# Altium footprint library Cty1.PcbLib: 1378 footprints (part 86 of 87)
Each footprint in its own frame and in the unit in brackets; x right, y up, seen from the top. Pads: shape width x height; smd on the part's side, far side on the other; paste and mask are expansions set on the pad; w line width, h text height; cw(c..) or ccw(c..) is an arc to the next point about the centre after c.
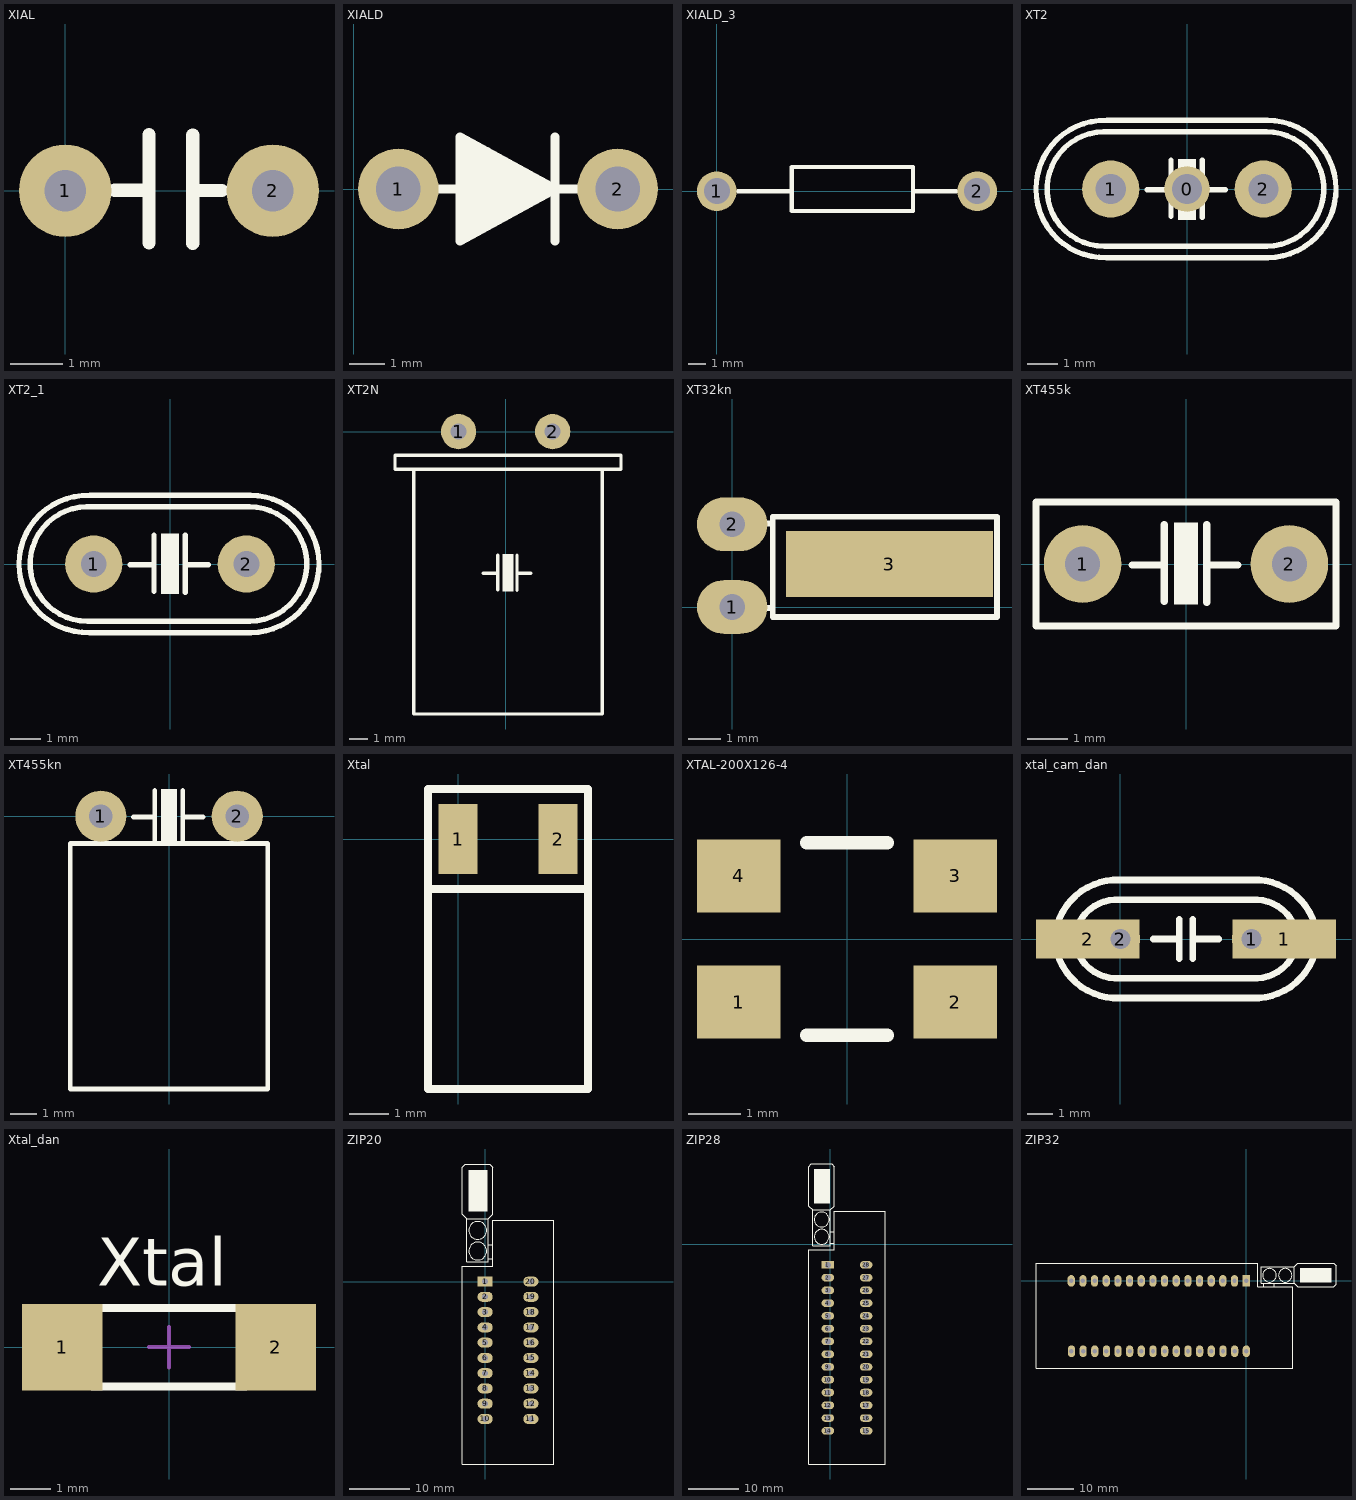
[diagram p85: the footprints below, top view; thin cyan lines are the x and y axes]

## XIAL [mil]
pads (2):
  round 70 hole 31.5 unplated: 1(0,0) 2(157.48,0)
Top Overlay:
  lines w10: 37.4,0.4 53.6,0.4 63.6,0.4 ; 63.6,-39.6 63.6,0.4 ; 63.6,42.4 63.6,0.4 ; 96.8,-39.8 96.8,42.2 ; 96.8,0.2 104.8,0.2 119,0.2

## XIALD [mil]
pads (2):
  round 90 hole 50 unplated: 1(50,0) 2(295,0)
Top Overlay:
  lines w10: 65,0 119,0 ; 127,-48 127,50 ; 127,46 135,46 135,-42 143,-42 143,42 149,42 149,-32 157,-32 157,34 163,34 163,-28 171,-28 171,24 179,24 179,-20 185,-20 185,18 191,18 191,-14 197,-14 197,12 201,12 201,-8 207,-8 ; 220,0 265,0 ; 225,-58 225,0 ; 225,58 225,0 ; 119,0 119,58 225,0 ; 119,0 119,-58 225,0 ; 207,-8 207,8 211,8 211,-8 207,-8

## XIALD_3 [mil]
pads (2):
  round 90 hole 59.05 unplated: 1(0,0) 2(590.55,0)
Top Overlay:
  lines w10: 47.95,0 166.06,0 ; 447.59,0 542.76,0 ; 170,-45 170,55 445,55 445,-45 170,-45

## XT2 [mm] "Footpin for Crystal 2 pin"
pads (3):
  round 1.524 hole 1: 0(0,0)
  round 1.905 hole 1: 1(-2.54,0) 2(2.54,0)
Top Overlay:
  region: 0.292,0.991 0.292,-1.016 -0.292,-1.016 -0.292,0.991
  lines w0.178: -2.769,1.905 ccw(c-2.756,0) -2.75,-1.905 ; -2.717,-1.905 2.617,-1.905 ; -2.692,1.905 2.642,1.905 ; -2.668,-2.286 2.69,-2.286 ccw(c2.675,0) 2.668,2.286 -2.666,2.286 ccw(c-2.743,0.001) -2.668,-2.283 ; -1.321,-0.025 -0.533,-0.025 ; -0.533,-0.914 -0.533,0.965 ; 0.508,-0.94 0.508,0.965 ; 0.508,-0.025 1.27,-0.025 ; 2.642,1.905 cw(c2.647,0) 2.66,-1.905
3D body "SW3dPS-HP49US.STEP": height 3.5, standoff -4, extent -5.929,-2.364 5.421,2.286

## XT2_1 [mil] "Footpin for Crystal 2 pin"
pads (2):
  round 75 hole 34: 1(-100,0) 2(100,0)
Top Overlay:
  region: 11.5,40 11.5,-39 -11.5,-39 -11.5,40
  lines w7: -109,75 ccw(c-108.5,0) -108.27,-75 ; -106.97,-75 103.03,-75 ; -105.97,75 104.03,75 ; -105.02,-90 105.91,-90 ccw(c105.31,0) 105.03,90 -104.97,90.01 ccw(c-108,0.06) -105.02,-89.89 ; -52,-1 -21,-1 ; -21,-36 -21,38 ; 20,-37 20,38 ; 20,-1 50,-1 ; 104,75 cw(c104.23,0) 104.73,-75
3D body "SW3dPS-HP49US.STEP": height 137.8, standoff -157.48, extent -233.43,-93.07 213.43,90

## XT2N [mil] "Crystal 2pin, high 200 mil"
height 200
pads (2):
  round 75 hole 34: 1(-100,0) 2(100,0)
Top Overlay:
  region: 16.5,-260 16.5,-339 -6.5,-339 -6.5,-260
  lines w7: -48,-301 -17,-301 ; -17,-336 -17,-262 ; 24,-337 24,-262 ; 24,-301 54,-301 ; -235,-80 -195,-80 ; -235,-80 -235,-50 ; -235,-80 -195,-80 ; -235,-80 -235,-50 ; -235,-50 245,-50 ; -235,-50 245,-50 ; -195,-600 -195,-80 ; -195,-600 205,-600 ; -195,-600 -195,-80 ; -195,-600 205,-600 ; -195,-80 205,-80 ; -195,-80 205,-80 ; 205,-600 205,-80 ; 205,-600 205,-80 ; 205,-80 245,-80 ; 205,-80 245,-80 ; 245,-80 245,-50 ; 245,-80 245,-50
3D body "SW3dPS-HC49U.STEP": height 91.44, standoff -92.52, extent -209.86,-594.33 230,14.33

## XT32kn [mil] "Crystal for 32,768kHz, 2pin"
height 150
pads (3):
  oval 85x65 hole 31: 1(0,0) 2(0,100)
  rect 250x80 smd: 3(190,52)
Top Overlay:
  lines w7: 34,-1 49,-1 ; 35,101 49,101 ; 49,101 49,-12 320,-12 320,109 49,109 49,101

## XT455k [mil] "Thach anh 455khz (Infrared)"
pads (2):
  round 75 hole 34: 1(-100,0) 2(100,0)
Top Overlay:
  region: 11.5,40 11.5,-39 -11.5,-39 -11.5,40
  lines w7: -52,-1 -21,-1 ; -21,-36 -21,38 ; 20,-37 20,38 ; 20,-1 50,-1 ; -145,-60 -145,60 145,60 145,-60 -145,-60

## XT455kn [mil] "Thach anh 455khz (Infrared)"
pads (2):
  round 75 hole 34: 1(-100,0) 2(100,0)
Top Overlay:
  region: 11.5,40 11.5,-39 -11.5,-39 -11.5,40
  lines w7: -52,-1 -21,-1 ; -21,-36 -21,38 ; 20,-37 20,38 ; 20,-1 50,-1 ; -145,-400 -145,-40 145,-40 145,-400 -145,-400

## Xtal [mm] "thach anh dan loai nho"
height 0.6
pads (2):
  rect 1x1.778 smd: 1(0,0) 2(2.54,0)
Top Overlay:
  lines w0.2: -0.762,-1.27 3.302,-1.27 ; -0.762,-6.35 3.302,-6.35 3.302,1.27 -0.762,1.27 -0.762,-5.588 -0.762,-6.35

## XTAL-200X126-4 [mil]
pads (4):
  rect 63x55 smd: 1(-81.5,-47.5) 2(81.5,-47.5) 3(81.5,47.5) 4(-81.5,47.5)
Top Overlay:
  lines w10: -30.5,-72.5 30.5,-72.5 ; -30.5,72.5 30.5,72.5
3D body: height 39.37, standoff 0, extent -114.46,-46.87 113.11,46.73
3D body: height 19.68, standoff 0, extent -97.83,24.91 -62.28,51.12
3D body: height 19.68, standoff 0, extent 67.17,24.91 102.72,51.12
3D body: height 19.68, standoff 0, extent -103.01,-51.67 -67.46,-25.46
3D body: height 19.68, standoff 0, extent 62.19,-52.22 97.74,-26.01

## xtal_cam_dan [mil]
pads (4):
  round 60 hole 30: 1(200,0) 2(0,0)
  rect 157.48x60 smd: 1(250,0) 2(-50,0)
Top Overlay:
  lines w10: 50,0 60,0 90,0 ; 90,-30 90,30 ; 110,-30 110,30 ; 110,0 150,0 120,0 ; -100,0 cw(c-5,-5) 0,90 200,90 cw(c205,-5) 300,0 cw(c205,5) 200,-90 0,-90 cw(c-5,5) -100,0 ; -70,0 cw(c-5,-5) 0,60 200,60 cw(c205,-5) 270,0 cw(c205,5) 200,-60 0,-60 cw(c-5,5) -70,0

## Xtal_dan [mm] "Thach Anh Dan 5.08mm"
height 3
pads (2):
  rect 2x2.15 smd: 1(-2.65,0) 2(2.65,0)
Top Overlay:
  lines w0.2: -1.9,-0.975 1.9,-0.975 ; -1.9,0.975 1.9,0.975
  text "Xtal" at -1.778,1.524 h1.2
Mechanical 13:
  lines w0.1: -2.54,-1 -2.54,1 2.54,1 2.54,-1 -2.54,-1
Mechanical 15:
  lines w0.1: -0.5,0 0.5,0 ; 0,-0.5 0,0.5
3D body: height 3, standoff 0, extent -2.54,-1 2.54,1

## ZIP20 [mil] "DIP 20, W 600mil/ L 1600mil"
height 300
pads (20):
  rect 100x65 hole 38: 1(0,0)
  oval 100x65 hole 38: 2(0,-100) 3(0,-200) 4(0,-300) 5(0,-400) 6(0,-500) 7(0,-600) 8(0,-700) 9(0,-800) 10(0,-900) 11(300,-900) 12(300,-800) 13(300,-700) 14(300,-600) 15(300,-500) 16(300,-400) 17(300,-300) 18(300,-200) 19(300,-100) 20(300,0)
Top Overlay:
  circle w7: c-48.31,335 r58.31
  circle w7: c-48.31,200 r58.31
  rectangle: -110,460 15,730
  lines w7: 20,150 50,150 ; 20,240 50,240 ; -120,410 -120,130 -110,130 20,130 20,410 ; -120,410 -150,440 -150,750 -130,770 30,770 50,750 50,440 20,410 ; -120,410 20,410 ; -150,-1195 -150,100 50,100 50,400 450,400 450,-1195 -150,-1195

## ZIP28 [mm]
height 0.305
pads (28):
  rect 2.5x1.5 hole 1.2: 1(-0.508,-4.064)
  oval 2.5x1.5 hole 1.2: 2(-0.508,-6.604) 3(-0.508,-9.144) 4(-0.508,-11.684) 5(-0.508,-14.224) 6(-0.508,-16.764) 7(-0.508,-19.304) 8(-0.508,-21.844) 9(-0.508,-24.384) 10(-0.508,-26.924) 11(-0.508,-29.464) 12(-0.508,-32.004) 13(-0.508,-34.544) 14(-0.508,-37.084) 15(7.112,-37.084) 16(7.112,-34.544) 17(7.112,-32.004) 18(7.112,-29.464) 19(7.112,-26.924) 20(7.112,-24.384) 21(7.112,-21.844) 22(7.112,-19.304) 23(7.112,-16.764) 24(7.112,-14.224) 25(7.112,-11.684) 26(7.112,-9.144) 27(7.112,-6.604) 28(7.112,-4.064)
Top Overlay:
  circle w0.178: c-1.735,4.953 r1.481
  circle w0.178: c-1.735,1.524 r1.481
  rectangle: -3.302,8.128 -0.127,14.986
  lines w0.178: 0,0.254 0.762,0.254 ; 0,2.54 0.762,2.54 ; -3.556,6.858 -3.556,-0.254 -3.302,-0.254 0,-0.254 0,6.858 ; -3.556,6.858 -4.318,7.62 -4.318,15.494 -3.81,16.002 0.254,16.002 0.762,15.494 0.762,7.62 0,6.858 ; -3.556,6.858 0,6.858 ; -4.318,-43.688 -4.318,-1.016 0.762,-1.016 0.762,6.604 10.922,6.604 10.922,-43.688 -4.318,-43.688

## ZIP32 [mil] "32 PIN, W 900 mil , L 2200 mil , Push Pro FOR Chip"
height 300
pads (32):
  rect 62x100 hole 38: 1(0,0)
  oval 62x100 hole 38: 2(-100,0) 3(-200,0) 4(-300,0) 5(-400,0) 6(-500,0) 7(-600,0) 8(-700,0) 9(-800,0) 10(-900,0) 11(-1000,0) 12(-1100,0) 13(-1200,0) 14(-1300,0) 15(-1400,0) 16(-1500,0) 17(-1498,-603) 18(-1398,-603) 19(-1298,-603) 20(-1198,-603) 21(-1099,-603) 22(-999,-603) 23(-899,-603) 24(-799,-603) 25(-699,-603) 26(-599,-603) 27(-499,-603) 28(-399,-603) 29(-299,-603) 30(-199,-603) 31(-99,-603) 32(1,-603)
Top Overlay:
  circle w7: c335,48.31 r58.31
  circle w7: c200,48.31 r58.31
  region: 460,110 460,-15 730,-15 730,110
  lines w7: 150,-50 150,-20 ; 240,-50 240,-20 ; 410,-20 440,-50 750,-50 770,-30 770,130 750,150 440,150 410,120 ; 410,-20 130,-20 130,110 130,120 410,120 ; 410,-20 410,120 ; -1802,-750 -1802,150 100,150 100,-50 400,-50 400,-600 400,-750 -1802,-750